# Altium footprint library microbuilder.PCBLIB: 422 footprints (part 11 of 27)
Each footprint in its own frame and in the unit in brackets; x right, y up, seen from the top. Pads: shape width x height; smd on the part's side, far side on the other; paste and mask are expansions set on the pad; w line width, h text height; cw(c..) or ccw(c..) is an arc to the next point about the centre after c.
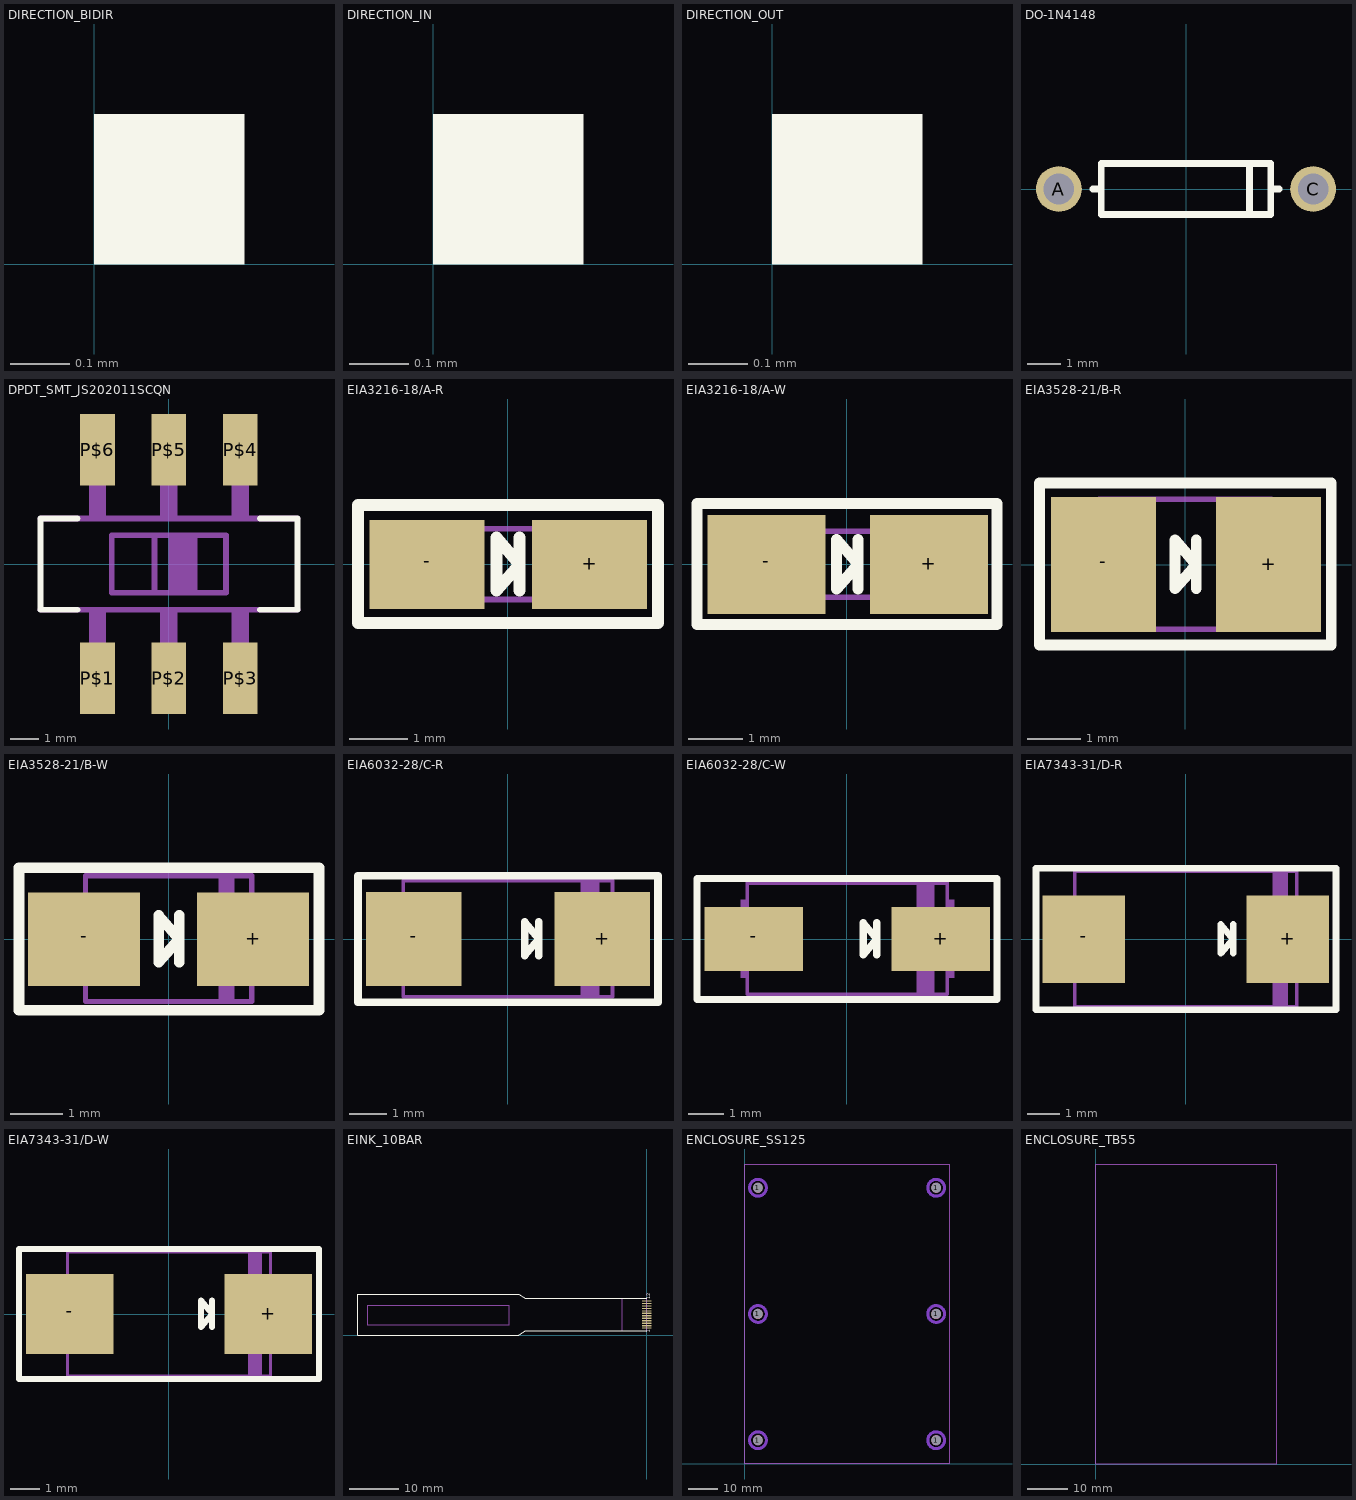
[diagram p10: the footprints below, top view; thin cyan lines are the x and y axes]

## DIRECTION_BIDIR [mil]
Top Overlay:
  region: 0,0 10,0 10,10 0,10
  region: 0,0 10,0 10,10 0,10

## DIRECTION_IN [mil]
Top Overlay:
  region: 0,0 10,0 10,10 0,10

## DIRECTION_OUT [mil]
Top Overlay:
  region: 0,0 10,0 10,10 0,10

## DO-1N4148 [mil]
pads (2):
  round 54 hole 36: A(-150,0) C(150,0)
Top Overlay:
  lines w8: -110,0 -100,0 ; 75,-25 75,25 ; 110,0 100,0 ; -100,0 -100,-30 100,-30 100,0 ; -100,0 -100,30 100,30 100,0

## DPDT_SMT_JS202011SCQN [mil]
pads (6):
  rect 48x99 smd: P$1(-98.43,-157.48) P$2(0,-157.48) P$3(99,-157.48) P$4(99,158) P$5(0,158) P$6(-98.43,158)
Top Overlay:
  lines w8: -125.98,-62.99 -177.17,-62.99 -177.17,63 -125.98,63 ; 126,-62.99 178,-62.99 178,63 126,63
Mechanical 16:
  rectangle: 0,-39.37 40,40
  rectangle: -11.81,63 12,154
  rectangle: -110.24,65 -86.61,154
  rectangle: 87,65 111,154
  region: 111,-64.96 87,-64.96 87,-153.54 111,-153.54
  region: 12,-64.96 -11.81,-64.96 -11.81,-153.54 12,-153.54
  region: -86.61,-64.96 -110.24,-64.96 -110.24,-153.54 -86.61,-153.54
  lines w5: -177.17,-62.99 -177.17,63 ; 178,-62.99 178,63
  lines w8: -177.17,-62.99 178,-62.99 ; -177.17,63 178,63 ; -19.68,-39.37 79,-39.37 79,40 -19.68,40 ; -19.68,-39.37 -78.74,-39.37 -78.74,40 -19.68,40 ; -19.68,-39.37 -19.68,40
  text "C&K" at 99,-9.84 h37.2

## EIA3216-18/A-R [mil]
pads (2):
  rect 77x60 smd: +(55,0) -(-54.13,0)
Top Overlay:
  lines w8: 8,-17.5 8,18 ; 101,35 101,-39.37 -100.49,-39.37 -100.49,40 101,40 101,36 ; -7.5,-17.5 -7.5,18 8,0 -7.5,-17.5
Mechanical 16:
  rectangle: -62.99,-23.62 -58.07,24
  rectangle: 59,-23.62 63,24
  rectangle: 32,-24.61 44,25
  lines w4: -57.09,-23.62 58,-23.62 58,24 -57.09,24 -57.09,-23.62

## EIA3216-18/A-W [mil]
pads (2):
  rect 85x71 smd: +(59,0) -(-58.07,0)
Top Overlay:
  lines w8: 8,-17.5 8,18 ; -107.99,-43.31 -107.99,44 108,44 108,-43.31 -107.99,-43.31 ; -7.5,-17.5 -7.5,18 8,0 -7.5,-17.5
Mechanical 16:
  rectangle: -62.99,-23.62 -58.07,24
  rectangle: 59,-23.62 63,24
  rectangle: 32,-24.61 44,25
  lines w4: -57.09,-23.62 58,-23.62 58,24 -57.09,24 -57.09,-23.62

## EIA3528-21/B-R [mil]
pads (2):
  rect 77x99 smd: +(61,0) -(-60.04,0)
Top Overlay:
  lines w8: 8,-17.5 8,18 ; -106.93,-59.06 -106.93,60 107,60 107,-59.06 -106.93,-59.06 ; -7.5,-17.5 -7.5,18 8,0 -7.5,-17.5
Mechanical 16:
  rectangle: -68.9,-23.62 -63.98,24
  rectangle: 64,-23.62 69,24
  rectangle: 38,-48.23 50,49
  lines w4: -62.99,-47.24 63,-47.24 63,48 -62.99,48 -62.99,-47.24

## EIA3528-21/B-W [mil]
pads (2):
  rect 85x71 smd: +(64,0) -(-63.98,0)
Top Overlay:
  lines w8: 8,-17.5 8,18 ; -113.37,-53.68 -113.37,54 114,54 114,-53.68 -113.37,-53.68 ; -7.5,-17.5 -7.5,18 8,0 -7.5,-17.5
Mechanical 16:
  rectangle: -68.9,-23.62 -63.98,24
  rectangle: 64,-23.62 69,24
  rectangle: 38,-48.23 50,49
  lines w4: -62.99,-47.24 63,-47.24 63,48 -62.99,48 -62.99,-47.24

## EIA6032-28/C-R [mil]
pads (2):
  rect 101x99 smd: +(100,0) -(-99.41,0)
Top Overlay:
  lines w8: 33,-17.5 33,18 ; -158.11,-66.93 -158.11,67 159,67 159,-66.93 -158.11,-66.93 ; 18,-17.5 18,18 33,0 18,-17.5
Mechanical 16:
  rectangle: -118.11,-43.31 -112.2,44
  rectangle: 113,-43.31 119,44
  rectangle: 77,-62.01 97,63
  lines w4: -110.24,-61.02 111,-61.02 111,62 -110.24,62 -110.24,-61.02

## EIA6032-28/C-W [mil]
pads (2):
  rect 109x71 smd: +(104,0) -(-103.35,0)
Top Overlay:
  lines w8: 33,-17.5 33,18 ; -165.98,-66.93 -165.98,67 166,67 166,-66.93 -165.98,-66.93 ; 18,-17.5 18,18 33,0 18,-17.5
Mechanical 16:
  rectangle: -118.11,-43.31 -112.2,44
  rectangle: 113,-43.31 119,44
  rectangle: 77,-62.01 97,63
  lines w4: -110.24,-61.02 111,-61.02 111,62 -110.24,62 -110.24,-61.02

## EIA7343-31/D-R [mil]
pads (2):
  rect 101x107 smd: +(125,0) -(-125,0)
Top Overlay:
  lines w8: 58,-17.5 58,18 ; -183.17,-86.61 -183.17,87 184,87 184,-86.61 -183.17,-86.61 ; 43,-17.5 43,18 58,0 43,-17.5
Mechanical 16:
  rectangle: -143.7,-47.24 -137.8,48
  rectangle: 138,-47.24 144,48
  rectangle: 106,-83.66 125,84
  lines w4: -135.83,-82.68 136,-82.68 136,83 -135.83,83 -135.83,-82.68

## EIA7343-31/D-W [mil]
pads (2):
  rect 117x107 smd: +(133,0) -(-132.87,0)
Top Overlay:
  lines w8: 58,-17.5 58,18 ; -200.67,-86.61 -200.67,87 201,87 201,-86.61 -200.67,-86.61 ; 43,-17.5 43,18 58,0 43,-17.5
Mechanical 16:
  rectangle: -143.7,-47.24 -137.8,48
  rectangle: 138,-47.24 144,48
  rectangle: 106,-83.66 125,84
  lines w4: -135.83,-82.68 136,-82.68 136,83 -135.83,83 -135.83,-82.68

## EINK_10BAR [mil]
pads (12):
  rect 79x10 smd: P$1(0,56) P$2(0,75) P$3(0,95) P$4(0,115) P$5(0,134) P$6(0,154) P$7(0,174) P$8(0,193) P$9(0,213) P$10(0,233) P$11(0,252) P$12(0,272)
Top Overlay:
  lines w8: 0,34 -973.23,34 -1023.62,0 -2311.81,0 -2311.81,326 -1023.62,326 -973.23,293 0,293
  text "1" at 40,20 h49.6
  text "12" at 40,288 h49.6
Mechanical 16:
  lines w8: -196.85,34 -196.85,293 ; 0,34 0,293 ; -2233.07,79 -2233.07,237 -1103.15,237 -1103.15,79 -2233.07,79

## ENCLOSURE_SS125 [mil]
pads (6):
  round 126 hole 126: 1(178,315) 1(178,1989) 1(178,3662) 1(2540,315) 1(2540,1989) 1(2540,3662)
Top Layer keep-out:
  circle w40: c178,1989 r111
  circle w40: c2540,1989 r111
  circle w40: c178,3662 r111
  circle w40: c2540,3662 r111
  circle w40: c178,315 r111
  circle w40: c2540,315 r111
Bottom Layer keep-out:
  circle w40: c178,1989 r111
  circle w40: c2540,1989 r111
  circle w40: c178,3662 r111
  circle w40: c2540,3662 r111
  circle w40: c178,315 r111
  circle w40: c2540,315 r111
Mechanical 1:
  lines w0: 0,0 2717,0 ; 0,3977 2717,3977
  lines w8: 0,0 0,3977 ; 2717,0 2717,3977
Mechanical 16:
  circle w8: c178,1989 r60
  circle w8: c2540,1989 r60
  circle w8: c178,3662 r60
  circle w8: c2540,3662 r60
  circle w8: c178,315 r60
  circle w8: c2540,315 r60
  text "3,0mm" at 128,1871 h37.2
  text "3,0mm" at 2491,1871 h37.2
  text "3,0mm" at 128,3544 h37.2
  text "3,0mm" at 2491,3544 h37.2
  text "3,0mm" at 128,197 h37.2
  text "3,0mm" at 2491,197 h37.2

## ENCLOSURE_TB55 [mil]
Mechanical 1:
  lines w0: 0,0 1772,0 1772,2953 0,2953 0,0